# Altium footprint library PCB_ConnectorHDR.PcbLib: 221 footprints (part 10 of 14)
Each footprint in its own frame and in the unit in brackets; x right, y up, seen from the top. Pads: shape width x height; smd on the part's side, far side on the other; paste and mask are expansions set on the pad; w line width, h text height; cw(c..) or ccw(c..) is an arc to the next point about the centre after c.
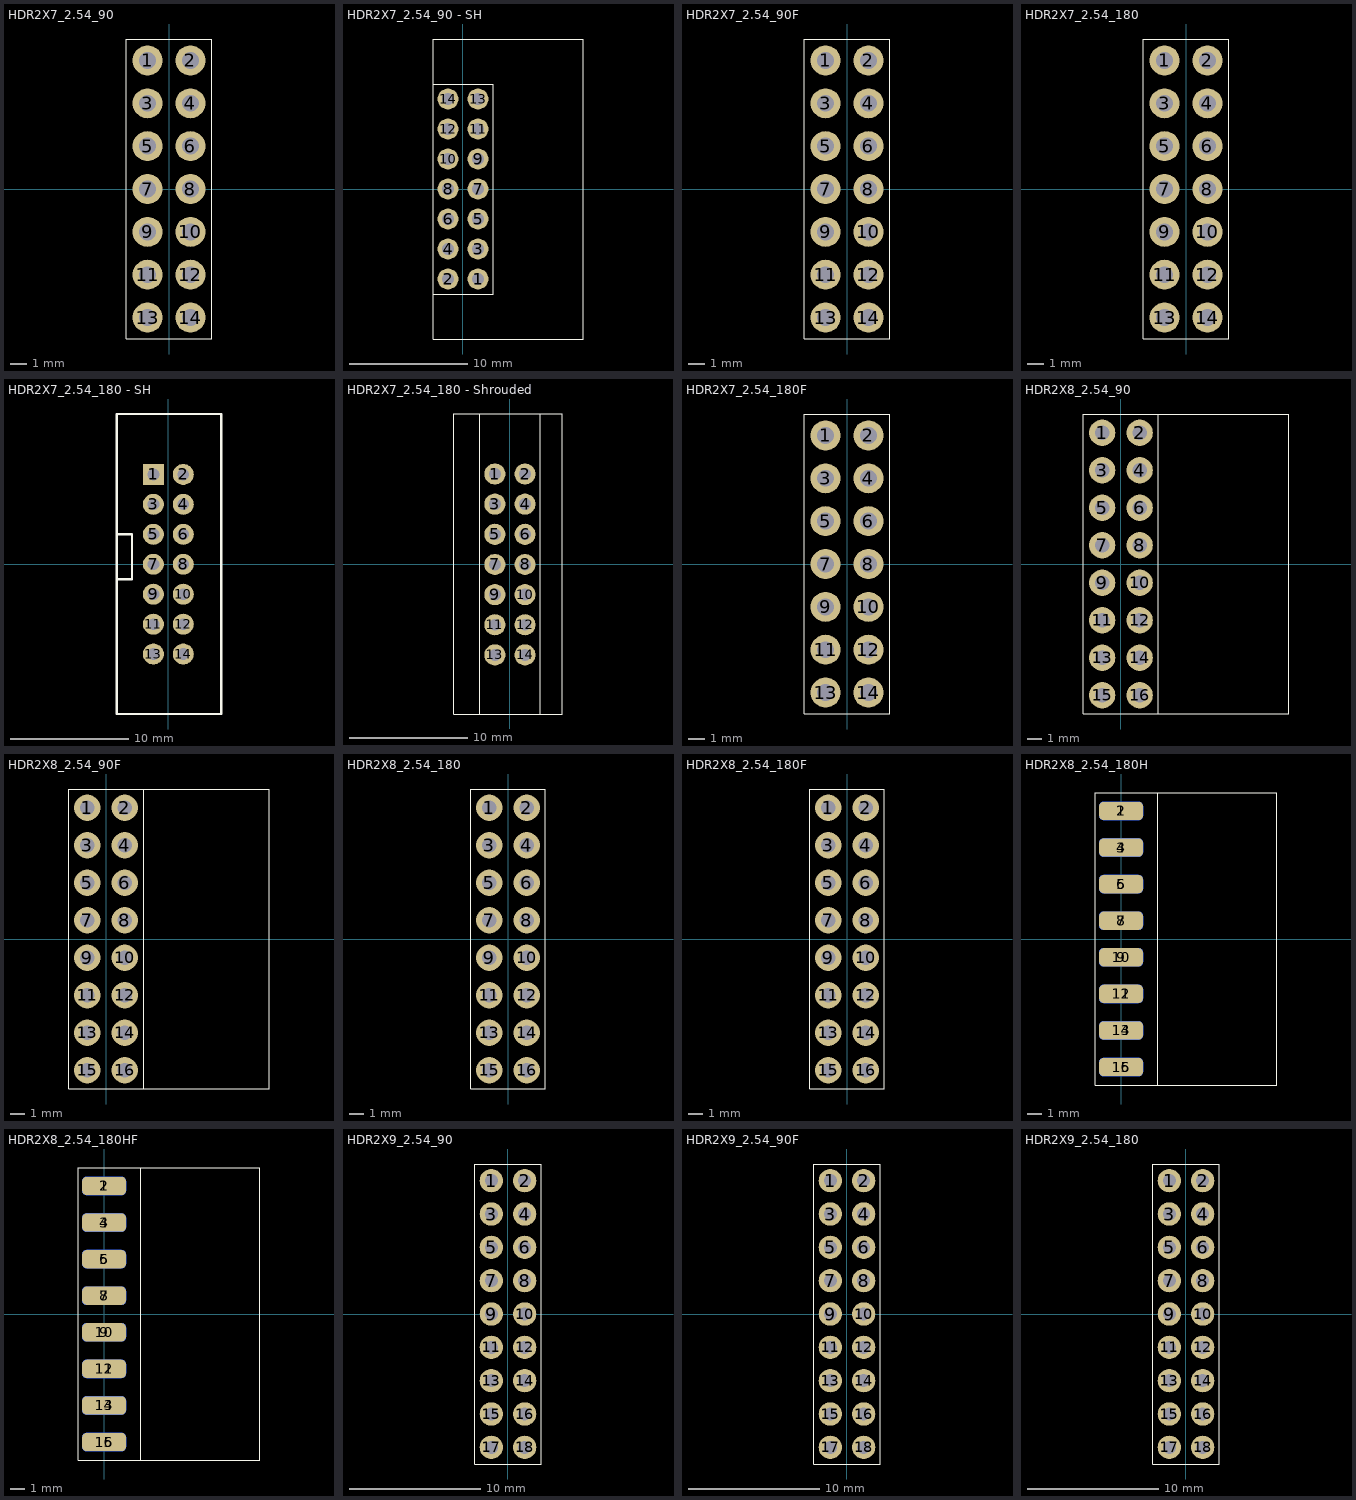
[diagram p9: the footprints below, top view; thin cyan lines are the x and y axes]

## HDR2X7_2.54_90 [mil]
height 169.29
pads (14):
  round 70 hole 39.37: 1(-50,300) 2(50,300) 3(-50,200) 4(50,200) 5(-50,100) 6(50,100) 7(-50,0) 8(50,0) 9(-50,-100) 10(50,-100) 11(-50,-200) 12(50,-200) 13(-50,-300) 14(50,-300)
Top Overlay:
  lines w2: -100,-350 -100,350 ; -100,-350 -100,350 ; -100,-350 100,-350 ; -100,-350 100,-350 ; -100,350 100,350 ; -100,350 100,350 ; 100,-350 100,350 ; 100,-350 100,350
3D body "pin_header_awl254-da-g14d.stp": height 197.35, standoff -117.61, extent -63,-350 444.09,350

## HDR2X7_2.54_90 - SH [mil]
pads (14):
  round 70 hole 39.37: 1(50,-300) 2(-50,-300) 3(50,-200) 4(-50,-200) 5(50,-100) 6(-50,-100) 7(50,0) 8(-50,0) 9(50,100) 10(-50,100) 11(50,200) 12(-50,200) 13(50,300) 14(-50,300)
Top Overlay:
  lines w2: -100,-500 -100,350 100,350 100,-350 -100,-350 -100,500 400,500 400,-500 -100,-500
3D body "702471451.stp": height 350.5, standoff -119.58, extent -61.76,-500 413.39,500

## HDR2X7_2.54_90F [mil]
height 169.29
pads (14):
  round 70 hole 39.37: 1(-50,300) 2(50,300) 3(-50,200) 4(50,200) 5(-50,100) 6(50,100) 7(-50,0) 8(50,0) 9(-50,-100) 10(50,-100) 11(-50,-200) 12(50,-200) 13(-50,-300) 14(50,-300)
Top Overlay:
  lines w2: -100,-350 100,-350 ; -100,-350 100,-350 ; -100,-350 -100,350 ; -100,-350 -100,350 ; -100,350 100,350 ; -100,350 100,350 ; 100,-350 100,350 ; 100,-350 100,350
3D body "female_header_A-BL254-DA-G14D.stp": height 197.35, standoff -125.48, extent -60,-354.84 436.06,355

## HDR2X7_2.54_180 [mil]
height 169.29
pads (14):
  round 70 hole 39.37: 1(-50,300) 2(50,300) 3(-50,200) 4(50,200) 5(-50,100) 6(50,100) 7(-50,0) 8(50,0) 9(-50,-100) 10(50,-100) 11(-50,-200) 12(50,-200) 13(-50,-300) 14(50,-300)
Top Overlay:
  lines w2: -100,-350 -100,350 ; -100,-350 -100,350 ; -100,-350 100,-350 ; -100,-350 100,-350 ; -100,350 100,350 ; -100,350 100,350 ; 100,-350 100,350 ; 100,-350 100,350
3D body "User Library-PLD-14.step": height 330.71, standoff -118.11, extent -98.43,-350 98.43,350

## HDR2X7_2.54_180 - SH [mil]
height 169.29
pads (14):
  rect 70x70 hole 39.37: 1(-50,300)
  round 70 hole 39.37: 2(50,300) 3(-50,200) 4(50,200) 5(-50,100) 6(50,100) 7(-50,0) 8(50,0) 9(-50,-100) 10(50,-100) 11(-50,-200) 12(50,-200) 13(-50,-300) 14(50,-300)
Top Overlay:
  lines w7.87: -172.81,-50 -121.4,-50 -121.4,100 -172.81,100 ; -172.81,-500 -172.81,501.63 177.12,501.63 177.12,-500 -172.81,-500

## HDR2X7_2.54_180 - Shrouded [mil]
height 169.29
pads (14):
  round 70 hole 39.37: 1(-50,300) 2(50,300) 3(-50,200) 4(50,200) 5(-50,100) 6(50,100) 7(-50,0) 8(50,0) 9(-50,-100) 10(50,-100) 11(-50,-200) 12(50,-200) 13(-50,-300) 14(50,-300)
Top Overlay:
  lines w2: -186,-496 -186,499 173,499 173,-496 -186,-496 ; -100,-496 -100,499 100,499 100,-496 -100,-496
3D body "SBH11-_ _ _C-D07-ST-_ _.STEP": height 346.96, standoff -129.42, extent -186.13,-496.28 172.13,499

## HDR2X7_2.54_180F [mil]
height 169.29
pads (14):
  round 70 hole 39.37: 1(-50,300) 2(50,300) 3(-50,200) 4(50,200) 5(-50,100) 6(50,100) 7(-50,0) 8(50,0) 9(-50,-100) 10(50,-100) 11(-50,-200) 12(50,-200) 13(-50,-300) 14(50,-300)
Top Overlay:
  lines w2: -100,-350 -100,350 ; -100,-350 -100,350 ; -100,-350 100,-350 ; -100,-350 100,-350 ; -100,350 100,350 ; -100,350 100,350 ; 100,-350 100,350 ; 100,-350 100,350
3D body "female_header_a-bl254-dg-g14d.stp": height 334.65, standoff -125.98, extent -98,-354.84 98.85,355

## HDR2X8_2.54_90 [mil]
height 169.29
pads (16):
  round 70 hole 39.37: 1(-50,350) 2(50,350) 3(-50,250) 4(50,250) 5(-50,150) 6(50,150) 7(-50,50) 8(50,50) 9(-50,-50) 10(50,-50) 11(-50,-150) 12(50,-150) 13(-50,-250) 14(50,-250) 15(-50,-350) 16(50,-350)
Top Overlay:
  lines w2: -100,-400 -100,400 ; -100,-400 447,-400 447,400 -100,400 ; -100,-400 -100,400 ; -100,-400 100,-400 100,400 -100,400
3D body "pin_header_awl254-da-g16d.stp": height 198.43, standoff -116.54, extent -60,-400 447.09,400

## HDR2X8_2.54_90F [mil]
height 169.29
pads (16):
  round 70 hole 39.37: 1(-50,350) 2(50,350) 3(-50,250) 4(50,250) 5(-50,150) 6(50,150) 7(-50,50) 8(50,50) 9(-50,-50) 10(50,-50) 11(-50,-150) 12(50,-150) 13(-50,-250) 14(50,-250) 15(-50,-350) 16(50,-350)
Top Overlay:
  lines w2: -100,-400 -100,400 ; -100,-400 436,-400 436,400 -100,400 ; -100,-400 -100,400 ; -100,-400 100,-400 100,400 -100,400
3D body "female_header_a-bl254-da-g16d.stp": height 198.43, standoff -124.41, extent -60,-404.92 436.06,404.92

## HDR2X8_2.54_180 [mil]
height 169.29
pads (16):
  round 70 hole 39.37: 1(-50,350) 2(50,350) 3(-50,250) 4(50,250) 5(-50,150) 6(50,150) 7(-50,50) 8(50,50) 9(-50,-50) 10(50,-50) 11(-50,-150) 12(50,-150) 13(-50,-250) 14(50,-250) 15(-50,-350) 16(50,-350)
Top Overlay:
  lines w2: -100,-400 100,-400 ; -100,-400 -100,400 ; -100,-400 100,-400 ; -100,-400 -100,400 ; -100,400 100,400 ; -100,400 100,400 ; 100,-400 100,400 ; 100,-400 100,400
3D body "pin_header_awl254-dg-g16d.stp": height 334.65, standoff -118.11, extent -100,-399.99 100,400.01

## HDR2X8_2.54_180F [mil]
height 169.29
pads (16):
  round 70 hole 39.37: 1(-50,350) 2(50,350) 3(-50,250) 4(50,250) 5(-50,150) 6(50,150) 7(-50,50) 8(50,50) 9(-50,-50) 10(50,-50) 11(-50,-150) 12(50,-150) 13(-50,-250) 14(50,-250) 15(-50,-350) 16(50,-350)
Top Overlay:
  lines w2: -100,-400 -100,400 ; -100,-400 100,-400 ; -100,-400 -100,400 ; -100,-400 100,-400 ; -100,400 100,400 ; -100,400 100,400 ; 100,-400 100,400 ; 100,-400 100,400
3D body "female_header_a-bl254-dg-g16d.stp": height 334.65, standoff -125.98, extent -98.42,-404.92 98.43,404.93

## HDR2X8_2.54_180H [mil]
height 169.29
pads (16):
  rrect50% 120x50 smd: 1(0,350) 3(0,250) 5(0,150) 7(0,50) 9(0,-50) 11(0,-150) 13(0,-250) 15(0,-350)
  rrect50% 120x50 smd far side: 2(0,350) 4(0,250) 6(0,150) 8(0,50) 10(0,-50) 12(0,-150) 14(0,-250) 16(0,-350)
Top Overlay:
  lines w2: -70,-400 -70,400 ; -70,-400 100,-400 ; -70,-400 425,-400 425,400 -70,400 ; -70,-400 -70,400 ; -70,-400 -70,400 ; -70,-400 100,-400 ; -70,400 100,400 ; -70,400 100,400 ; 100,-400 100,400 ; 100,-400 100,400
3D body "pin_header_awl254-dg-g16d.stp": height 100, standoff -100, extent -38.11,-399.99 414.65,400.01

## HDR2X8_2.54_180HF [mil]
height 169.29
pads (16):
  rrect50% 120x50 smd: 1(0,350) 3(0,250) 5(0,150) 7(0,50) 9(0,-50) 11(0,-150) 13(0,-250) 15(0,-350)
  rrect50% 120x50 smd far side: 2(0,350) 4(0,250) 6(0,150) 8(0,50) 10(0,-50) 12(0,-150) 14(0,-250) 16(0,-350)
Top Overlay:
  lines w2: -70,-400 -70,400 ; -70,-400 100,-400 ; -70,-400 425,-400 425,400 -70,400 ; -70,-400 -70,400 ; -70,-400 -70,400 ; -70,-400 100,-400 ; -70,400 100,400 ; -70,400 100,400 ; 100,-400 100,400 ; 100,-400 100,400
3D body "female_header_a-bl254-dg-g16d.stp": height 88.43, standoff -108.43, extent -35.98,-404.92 424.65,404.92

## HDR2X9_2.54_90 [mil]
height 169.29
pads (18):
  round 70 hole 39.37: 1(-50,400) 2(50,400) 3(-50,300) 4(50,300) 5(-50,200) 6(50,200) 7(-50,100) 8(50,100) 9(-50,0) 10(50,0) 11(-50,-100) 12(50,-100) 13(-50,-200) 14(50,-200) 15(-50,-300) 16(50,-300) 17(-50,-400) 18(50,-400)
Top Overlay:
  lines w2: -100,-450 100,-450 ; -100,-450 -100,450 ; -100,-450 100,-450 ; -100,-450 -100,450 ; -100,450 100,450 ; -100,450 100,450 ; 100,-450 100,450 ; 100,-450 100,450
3D body "pin_header_awl254-da-g18d.stp": height 197.35, standoff -117.61, extent -63,-450 444.09,450

## HDR2X9_2.54_90F [mil]
height 169.29
pads (18):
  round 70 hole 39.37: 1(-50,400) 2(50,400) 3(-50,300) 4(50,300) 5(-50,200) 6(50,200) 7(-50,100) 8(50,100) 9(-50,0) 10(50,0) 11(-50,-100) 12(50,-100) 13(-50,-200) 14(50,-200) 15(-50,-300) 16(50,-300) 17(-50,-400) 18(50,-400)
Top Overlay:
  lines w2: -100,-450 -100,450 ; -100,-450 100,-450 ; -100,-450 -100,450 ; -100,-450 100,-450 ; -100,450 100,450 ; -100,450 100,450 ; 100,-450 100,450 ; 100,-450 100,450
3D body "female_header_A-BL254-DA-G18D.stp": height 197.35, standoff -125.48, extent -60,-454.84 436.06,455

## HDR2X9_2.54_180 [mil]
height 169.29
pads (18):
  round 70 hole 39.37: 1(-50,400) 2(50,400) 3(-50,300) 4(50,300) 5(-50,200) 6(50,200) 7(-50,100) 8(50,100) 9(-50,0) 10(50,0) 11(-50,-100) 12(50,-100) 13(-50,-200) 14(50,-200) 15(-50,-300) 16(50,-300) 17(-50,-400) 18(50,-400)
Top Overlay:
  lines w2: -100,-450 100,-450 ; -100,-450 -100,450 ; -100,-450 100,-450 ; -100,-450 -100,450 ; -100,450 100,450 ; -100,450 100,450 ; 100,-450 100,450 ; 100,-450 100,450
3D body "User Library-PLD-18.step": height 330.71, standoff -118.11, extent -98,-450 98.85,450